# Altium footprint library 集大电协1.5.PcbLib: 273 footprints (part 17 of 18)
Each footprint in its own frame and in the unit in brackets; x right, y up, seen from the top. Pads: shape width x height; smd on the part's side, far side on the other; paste and mask are expansions set on the pad; w line width, h text height; cw(c..) or ccw(c..) is an arc to the next point about the centre after c.
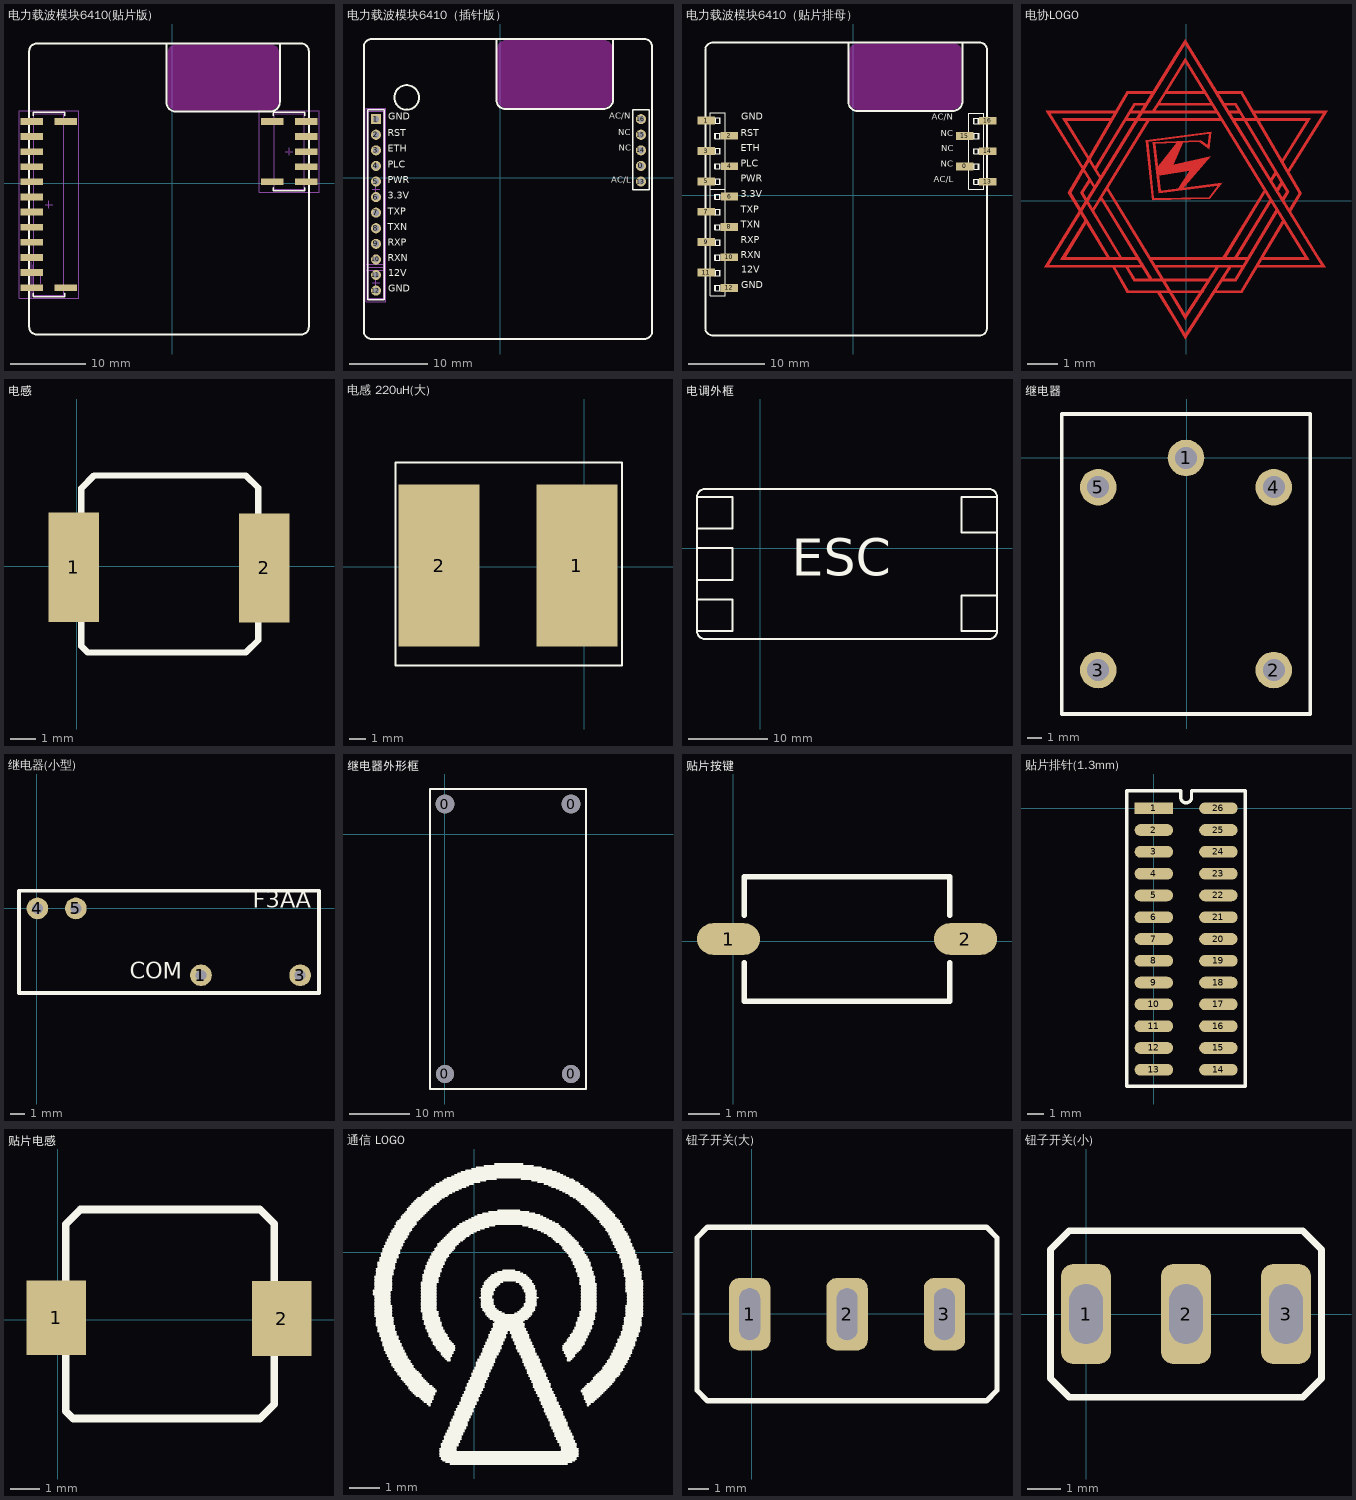
[diagram p16: the footprints below, top view; thin cyan lines are the x and y axes]

## 电力载波模块6410(贴片版) [mm]
pads (21):
  rect 3x0.89 smd: 0(-14.05,-13.8) 0(-14.05,8.2) 0(13.25,0.2) 0(13.25,8.2) 0(17.75,2.2) 1(-18.55,8.2) 2(-18.55,6.2) 3(-18.55,4.2) 4(-18.55,2.2) 5(-18.55,0.2) 6(-18.55,-1.8) 7(-18.55,-3.8) 8(-18.55,-5.8) 9(-18.55,-7.8) 10(-18.55,-9.8) 11(-18.55,-11.8) 12(-18.55,-13.8) 13(17.75,0.2) 14(17.75,4.2) 15(17.75,6.2) 16(17.75,8.2)
Top Overlay:
  lines w0.2: -18.375,-14.55 -18.375,-15 -14.225,-15 -14.225,-14.55 ; -18.375,8.95 -18.375,9.4 -14.225,9.4 -14.225,8.95 ; 13.425,-0.55 13.425,-1 17.575,-1 17.575,-0.55 ; 13.425,8.95 13.425,9.4 17.575,9.4 17.575,8.95
  lines w0.254: -0.729,18.511 -0.729,10.711 ccw(c0.471,10.711) 0.471,9.511 12.99,9.511 ccw(c12.99,10.793) 14.271,10.793 14.271,18.511 ; -18.9,-19 ccw(c-17.9,-19) -17.9,-20 17.1,-20 ccw(c17.1,-19) 18.1,-19 18.1,17.5 ccw(c17.1,17.5) 17.1,18.5 -17.9,18.5 ccw(c-17.9,17.5) -18.9,17.5 -18.9,-19
Keep-Out Layer:
  board cut-out: -0.574,10.764 -0.575,10.768 -0.576,10.774 -0.576,10.781 -0.577,10.787 -0.577,10.791 -0.577,17.321 -0.577,17.323 -0.577,17.325 -0.577,17.328 -0.576,17.331 -0.576,17.332 -0.573,17.434 -0.528,17.633 -0.446,17.819 -0.33,17.986 -0.184,18.128 -0.013,18.24 0.176,18.316 0.376,18.355 0.477,18.355 13.138,18.355 13.236,18.355 13.427,18.317 13.607,18.243 13.769,18.134 13.907,17.996 14.015,17.834 14.09,17.654 14.128,17.463 14.128,17.365 14.128,10.799 14.128,10.796 14.128,10.789 14.127,10.782 14.126,10.775 14.125,10.772 14.117,10.661 14.06,10.446 13.964,10.246 13.833,10.068 13.67,9.916 13.482,9.798 13.276,9.717 13.058,9.676 12.947,9.676 0.501,9.676 0.495,9.676 0.484,9.677 0.473,9.679 0.462,9.682 0.456,9.684 0.356,9.695 0.161,9.753 -0.021,9.844 -0.184,9.964 -0.324,10.111 -0.437,10.28 -0.518,10.466 -0.567,10.663
  lines w0.254: -0.449,10.791 -0.449,17.321 ; -0.449,10.844 ccw(c0.592,10.844) 0.592,9.803 ; -0.449,17.301 cw(c0.477,17.301) 0.477,18.228 13.138,18.228 cw(c13.138,17.365) 14.001,17.365 14.001,10.799 ; 0.501,9.803 12.947,9.803 ccw(c12.947,10.857) 14.001,10.857
Mechanical 13:
  lines w0.1: -18.341,-10.789 -18.341,-14.789 -16.341,-14.789 ; -18.3,-14.05 -19.4,-14.05 -19.4,-13.55 -18.3,-13.55 ; -18.3,-12.05 -19.4,-12.05 -19.4,-11.55 -18.3,-11.55 ; -18.3,-10.05 -19.4,-10.05 -19.4,-9.55 -18.3,-9.55 ; -18.3,-8.05 -19.4,-8.05 -19.4,-7.55 -18.3,-7.55 ; -18.3,-6.05 -19.4,-6.05 -19.4,-5.55 -18.3,-5.55 ; -18.3,-4.05 -19.4,-4.05 -19.4,-3.55 -18.3,-3.55 ; -18.3,-2.05 -19.4,-2.05 -19.4,-1.55 -18.3,-1.55 ; -18.3,-0.05 -19.4,-0.05 -19.4,0.45 -18.3,0.45 ; -18.3,1.95 -19.4,1.95 -19.4,2.45 -18.3,2.45 ; -18.3,3.95 -19.4,3.95 -19.4,4.45 -18.3,4.45 ; -18.3,5.95 -19.4,5.95 -19.4,6.45 -18.3,6.45 ; -18.3,7.95 -19.4,7.95 -19.4,8.45 -18.3,8.45 ; -14.3,-14.05 -13.2,-14.05 -13.2,-13.55 -14.3,-13.55 ; -14.3,7.95 -13.2,7.95 -13.2,8.45 -14.3,8.45 ; 13.5,-0.05 12.4,-0.05 12.4,0.45 13.5,0.45 ; 13.5,7.95 12.4,7.95 12.4,8.45 13.5,8.45 ; 17.5,-0.05 18.6,-0.05 18.6,0.45 17.5,0.45 ; 17.5,1.95 18.6,1.95 18.6,2.45 17.5,2.45 ; 17.5,3.95 18.6,3.95 18.6,4.45 17.5,4.45 ; 17.5,5.95 18.6,5.95 18.6,6.45 17.5,6.45 ; 17.5,7.95 18.6,7.95 18.6,8.45 17.5,8.45 ; -18.3,-14.8 -14.3,-14.8 -14.3,9.2 -18.3,9.2 -18.3,-14.8 ; 13.5,-0.8 17.5,-0.8 17.5,9.2 13.5,9.2 13.5,-0.8
Mechanical 15:
  lines w0.05: -18.616,-10.389 -18.616,-15.189 -16.066,-15.189 ; -17.341,-13.289 -17.341,-12.289 ; -16.8,-2.8 -15.8,-2.8 ; -16.3,-3.3 -16.3,-2.3 ; 15,4.2 16,4.2 ; 15.5,3.7 15.5,4.7 ; -20.25,-15.2 -12.35,-15.2 -12.35,9.6 -20.25,9.6 -20.25,-15.2 ; 11.55,-1.2 19.45,-1.2 19.45,9.6 11.55,9.6 11.55,-1.2
3D body "62131021921.stp": height 6.7, standoff 0, extent 12.4,-0.8 18.6,9.2
3D body "62132421921.stp": height 6.7, standoff 0, extent -19.4,-14.8 -13.2,9.2

## 电力载波模块6410（插针版） [mm]
pads (17):
  round 1.3 hole 0.8: 0(18.059,1.511) 2(-15.941,5.511) 3(-15.941,3.511) 4(-15.941,1.511) 5(-15.941,-0.489) 6(-15.941,-2.489) 7(-15.941,-4.489) 8(-15.941,-6.489) 9(-15.941,-8.489) 10(-15.941,-10.489) 11(-15.941,-12.489) 12(-15.941,-14.489) 13(18.059,-0.489) 14(18.059,3.511) 15(18.059,5.511) 16(18.059,7.511)
  rect 1.3x1.3 hole 0.8: 1(-15.941,7.511)
Top Overlay:
  circle w0.254: c-12,10.3 r1.581
  lines w0.2: -17.016,-11.689 -17.016,8.711 -14.866,8.711 -14.866,-11.689 ; -17.016,-11.289 -17.016,-15.689 -14.866,-15.689 -14.866,-11.289 ; 16.984,-1.555 16.984,8.711 19.134,8.711 19.134,-1.555 16.984,-1.555
  lines w0.254: -0.5,17.8 -0.5,9.999 ccw(c0.699,9.999) 0.699,8.8 13.218,8.8 ccw(c13.218,10.082) 14.5,10.082 14.5,17.8 ; -17.5,-19.7 ccw(c-16.5,-19.7) -16.5,-20.7 18.5,-20.7 ccw(c18.5,-19.7) 19.5,-19.7 19.5,16.8 ccw(c18.5,16.8) 18.5,17.8 -16.5,17.8 ccw(c-16.5,16.8) -17.5,16.8 -17.5,-19.7
  text "NC" at 15.182,3.17 h1.4
  text "NC" at 15.156,5.125 h1.4
  text "AC/L" at 14.242,-0.945 h1.4
  text "AC/N" at 13.963,7.259 h1.4
  text "GND" at -14.358,-14.966 h1.52
  text "12V" at -14.36,-12.973 h1.52
  text "RXN" at -14.46,-11.067 h1.52
  text "RXP" at -14.46,-9.06 h1.52
  text "TXN" at -14.458,-7.054 h1.52
  text "TXP" at -14.458,-5.047 h1.52
  text "3.3V" at -14.46,-3.026 h1.52
  text "PWR" at -14.46,-1.034 h1.52
  text "PLC" at -14.46,0.987 h1.52
  text "ETH" at -14.46,2.979 h1.52
  text "RST" at -14.46,5 h1.52
  text "GND" at -14.358,7.107 h1.52
Keep-Out Layer:
  board cut-out: -0.345,10.053 -0.346,10.056 -0.347,10.063 -0.348,10.07 -0.348,10.076 -0.348,10.079 -0.348,16.61 -0.348,16.611 -0.348,16.614 -0.348,16.617 -0.348,16.62 -0.348,16.621 -0.345,16.723 -0.3,16.921 -0.218,17.108 -0.101,17.275 0.045,17.417 0.215,17.528 0.404,17.605 0.604,17.644 0.706,17.644 13.367,17.644 13.464,17.644 13.655,17.606 13.836,17.531 13.998,17.423 14.136,17.285 14.244,17.123 14.319,16.943 14.357,16.752 14.357,16.654 14.357,10.088 14.357,10.085 14.356,10.078 14.355,10.071 14.354,10.064 14.353,10.06 14.345,9.95 14.289,9.735 14.193,9.535 14.061,9.356 13.899,9.205 13.711,9.087 13.504,9.006 13.286,8.964 13.175,8.964 0.729,8.964 0.724,8.964 0.712,8.965 0.701,8.967 0.69,8.97 0.685,8.972 0.584,8.984 0.39,9.042 0.208,9.133 0.045,9.253 -0.095,9.4 -0.208,9.569 -0.29,9.755 -0.338,9.952
  lines w0.254: -0.221,10.079 -0.221,16.61 ; -0.221,10.133 ccw(c0.821,10.133) 0.821,9.092 ; -0.221,16.59 cw(c0.706,16.59) 0.706,17.517 13.367,17.517 cw(c13.367,16.654) 14.229,16.654 14.229,10.088 ; 0.729,9.092 13.175,9.092 ccw(c13.175,10.146) 14.229,10.146
Mechanical 13:
  lines w0.1: -16.941,-11.489 -14.941,-11.489 ; -16.941,-11.489 -16.941,-15.489 -14.941,-15.489 -14.941,-11.489 ; -16.941,-11.489 -16.941,8.511 -14.941,8.511 -14.941,-11.489 ; -16.941,-11.489 -14.941,-11.489
Mechanical 15:
  lines w0.05: -16.441,-13.489 -15.441,-13.489 ; -16.441,-1.489 -15.441,-1.489 ; -15.941,-13.989 -15.941,-12.989 ; -15.941,-1.989 -15.941,-0.989 ; -17.216,-15.889 -17.216,-11.089 -14.666,-11.089 -14.666,-15.889 -17.216,-15.889 ; -17.216,-11.889 -17.216,8.911 -14.666,8.911 -14.666,-11.889 -17.216,-11.889
3D body "62000211821.stp": height 4.35, standoff -2.65, extent -17.149,-15.616 -14.649,-11.116
3D body "62001011821.stp": height 4.35, standoff -2.65, extent -17.139,-11.569 -14.639,8.931
3D body "62000211821.stp": height 4.35, standoff -2.65, extent 16.782,2.255 19.282,6.755
3D body "62000211821.stp": height 4.35, standoff -2.65, extent 16.802,-1.788 19.302,2.712
3D body "62000211821.stp": height 4.35, standoff -2.65, extent 16.797,4.41 19.297,8.91

## 电力载波模块6410（贴片排母） [mil]
pads (17):
  rect 90.16x40.16 smd mask+0: 0(575,148.26) 1(-762,385.74) 2(-642,307) 3(-762,228.26) 4(-641,150) 5(-761,71.26) 6(-641,-7.48) 7(-761,-86.22) 8(-642,-164) 9(-762,-242.74) 10(-642,-321.48) 11(-762,-400.22) 12(-642,-479.48) 13(695,69.52) 14(695,227) 15(575,305.74) 16(695,384.48)
Top Overlay:
  drawing of 154 lines, arcs and shapes, not listed
  text "NC" at 452.71,214.79 h55
  text "NC" at 451.71,291.79 h55
  text "AC/L" at 415.71,52.79 h55
  text "AC/N" at 404.71,375.79 h55
  text "GND" at -579.29,-493.21 h60
  text "12V" at -579.35,-414.77 h60
  text "RXN" at -583.28,-339.7 h60
  text "RXP" at -583.28,-260.7 h60
  text "TXN" at -583.23,-181.7 h60
  text "TXP" at -583.23,-102.7 h60
  text "3.3V" at -583.28,-23.15 h60
  text "PWR" at -583.28,55.3 h60
  text "PLC" at -583.28,134.85 h60
  text "ETH" at -583.28,213.3 h60
  text "RST" at -583.28,292.85 h60
  text "GND" at -579.29,375.79 h60
  text "NC" at 451.71,132.79 h55
Top Paste:
  region: 740.08,49.44 649.92,49.44 649.92,89.6 740.08,89.6
  region: 620.08,128.18 529.92,128.18 529.92,168.34 620.08,168.34
  region: 740.08,206.92 649.92,206.92 649.92,247.08 740.08,247.08
  region: 620.08,285.66 529.92,285.66 529.92,325.82 620.08,325.82
  region: 740.08,364.4 649.92,364.4 649.92,404.56 740.08,404.56
  region: -807.08,405.82 -716.92,405.82 -716.92,365.66 -807.08,365.66
  region: -687.08,327.08 -596.92,327.08 -596.92,286.92 -687.08,286.92
  region: -807.08,248.34 -716.92,248.34 -716.92,208.18 -807.08,208.18
  region: -687.08,169.6 -596.92,169.6 -596.92,129.44 -687.08,129.44
  region: -807.08,90.86 -716.92,90.86 -716.92,50.7 -807.08,50.7
  region: -806.08,-66.14 -715.92,-66.14 -715.92,-106.3 -806.08,-106.3
  region: -687.08,-301.4 -596.92,-301.4 -596.92,-341.56 -687.08,-341.56
  region: -807.08,-222.66 -716.92,-222.66 -716.92,-262.82 -807.08,-262.82
  region: -687,-143.66 -596.84,-143.66 -596.84,-183.82 -687,-183.82
  region: -686,12.42 -595.84,12.42 -595.84,-27.74 -686,-27.74
  region: -807.08,-380.66 -716.92,-380.66 -716.92,-420.82 -807.08,-420.82
  region: -687.08,-459.4 -596.92,-459.4 -596.92,-499.56 -687.08,-499.56
Top Solder:
  region: 742.09,47.43 647.91,47.43 647.91,91.61 742.09,91.61
  region: 622.09,126.17 527.91,126.17 527.91,170.35 622.09,170.35
  region: 742.09,204.91 647.91,204.91 647.91,249.09 742.09,249.09
  region: 622.09,283.65 527.91,283.65 527.91,327.83 622.09,327.83
  region: 742.09,362.39 647.91,362.39 647.91,406.57 742.09,406.57
  region: -809.09,407.83 -714.91,407.83 -714.91,363.65 -809.09,363.65
  region: -689.09,329.09 -594.91,329.09 -594.91,284.91 -689.09,284.91
  region: -809.09,250.35 -714.91,250.35 -714.91,206.17 -809.09,206.17
  region: -689.09,171.61 -594.91,171.61 -594.91,127.43 -689.09,127.43
  region: -809.09,92.87 -714.91,92.87 -714.91,48.69 -809.09,48.69
  region: -808.09,-64.13 -713.91,-64.13 -713.91,-108.31 -808.09,-108.31
  region: -809.09,-378.13 -714.91,-378.13 -714.91,-422.31 -809.09,-422.31
  region: -689.09,-299.39 -594.91,-299.39 -594.91,-343.57 -689.09,-343.57
  region: -809.09,-220.65 -714.91,-220.65 -714.91,-264.83 -809.09,-264.83
  region: -689,-141.56 -594.82,-141.56 -594.82,-185.74 -689,-185.74
  region: -689,14.35 -594.82,14.35 -594.82,-29.83 -689,-29.83
  region: -689.09,-457.39 -594.91,-457.39 -594.91,-501.57 -689.09,-501.57
Keep-Out Layer:
  board cut-out: -20.6,484.79 -20.63,484.92 -20.67,485.18 -20.69,485.44 -20.71,485.7 -20.71,485.83 -20.71,742.94 -20.71,742.99 -20.71,743.1 -20.7,743.21 -20.69,743.31 -20.69,743.37 -20.57,747.38 -18.8,755.2 -15.57,762.54 -10.99,769.13 -5.24,774.71 1.48,779.09 8.92,782.11 16.79,783.64 20.8,783.64 519.25,783.64 523.09,783.64 530.62,782.15 537.71,779.21 544.09,774.95 549.52,769.52 553.78,763.13 556.72,756.04 558.22,748.51 558.22,744.68 558.22,486.18 558.22,486.04 558.2,485.76 558.17,485.49 558.13,485.22 558.1,485.08 557.78,480.72 555.54,472.28 551.76,464.4 546.59,457.36 540.19,451.41 532.8,446.75 524.67,443.56 516.08,441.93 511.71,441.93 21.71,441.93 21.49,441.93 21.04,441.97 20.61,442.05 20.18,442.16 19.97,442.24 16,442.7 8.34,444.98 1.19,448.55 -5.24,453.3 -10.75,459.08 -15.19,465.73 -18.41,473.05 -20.33,480.81
  lines w10: -15.69,485.83 -15.69,742.94 ; -15.69,487.94 ccw(c25.31,487.94) 25.31,446.94 ; -15.69,742.14 cw(c20.8,742.14) 20.8,778.63 519.25,778.63 cw(c519.25,744.68) 553.2,744.68 553.2,486.18 ; 21.71,446.94 511.71,446.94 ccw(c511.71,488.44) 553.2,488.44
3D body "HDR2.0-M-LI-12P.STEP": height 216.54, standoff -89.5, extent -739.57,-517.87 -660.83,427.01
3D body "HDR2.0-M-LI-5P.STEP": height 216.54, standoff -89.5, extent 595.38,28.72 674.12,422.42

## 电协LOGO [mm]
Top Layer:
  region: 2.969,0.374 3.122,0.628 3.172,0.578 3.172,0.527 3.045,0.324 2.995,0.324
  region: 2.766,0.705 2.918,0.959 2.969,0.908 2.969,0.857 2.842,0.654 2.791,0.654
  region: 1.648,2.711 4.087,2.711 4.112,2.711 3.172,1.213 3.147,1.34 3.96,2.635 1.674,2.635
  region: 2.207,2.965 4.646,2.965 4.671,2.965 3.401,0.933 3.337,0.997 4.519,2.889 2.233,2.889
  region: -0.663,3.6 0.607,3.6 0.632,3.575 0.658,3.549 0.683,3.524 -0.714,3.524
  region: 1.928,2.711 1.572,2.711 1.521,2.66 1.598,2.635 1.623,2.635 1.648,2.635 1.928,2.635
  region: 1.75,2.965 1.394,2.965 1.344,2.914 1.445,2.914 1.471,2.889 1.75,2.889
  region: -1.323,3.219 -1.73,3.219 -3.013,1.098 -2.949,1.035 -1.679,3.143 -1.374,3.143
  region: -0.942,3.219 0.836,3.219 0.81,3.219 0.861,3.194 0.861,3.143 -0.993,3.143
  region: -2.009,2.635 -1.958,2.711 1.115,2.711 1.166,2.635
  region: -1.781,2.965 0.988,2.965 0.988,2.94 1.013,2.889 -1.831,2.889
  region: 0.836,2.279 0.759,1.695 0.429,1.949 0.48,2 0.709,1.822 0.759,2.203 -1.247,1.949 -1.057,0.082 0.759,0.12 1.039,0.501 -0.892,0.247 -1.095,1.924 0.48,2 0.455,1.975 0.429,1.949 -1.019,1.873 -0.841,0.324 1.064,0.578 1.191,0.603 0.785,0.07 -1.12,0.019 -1.323,2
  region: -2.816,0.06 -1.192,-2.61 -1.108,-2.61 -1.117,-2.57 -2.797,0.171
  region: -2.613,0.364 -0.333,-3.385 -0.021,-3.914 1.115,-2.14 1.013,-2.14 -0.021,-3.74 -0.866,-2.343 -2.593,0.476
  region: -0.942,-3.029 -0.333,-4.02 -0.021,-4.549 1.521,-2.14 1.42,-2.14 -0.021,-4.375 -0.866,-2.978 -0.942,-3.004
  region: -1.895,-2.953 -0.828,-2.953 0.594,-2.953 0.569,-3.029 -1.946,-3.029 -2.454,-2.14 -2.352,-2.166
  region: -3.178,0.654 -3.193,0.746 -3.482,0.273 -2.173,-1.909 -2.111,-1.861 -3.381,0.273 -3.119,0.671
  region: 3.198,-0.591 1.801,-2.953 0.963,-2.953 0.912,-3.029 1.852,-3.029 3.249,-0.692
  region: 2.966,-0.266 1.598,-2.572 1.217,-2.572 1.191,-2.648 1.648,-2.648 3.045,-0.311
  region: 2.791,0.095 1.572,-1.886 1.674,-1.912 2.842,0.019
  region: 2.588,0.4 1.191,-1.873 1.217,-1.912 1.318,-1.861 2.639,0.324
  region: -1.298,2.66 -3.089,-0.273 -3.038,-0.349 -1.196,2.66
  region: -2.428,2.711 -4.079,2.711 -2.847,0.73 -2.771,0.755 -3.927,2.635 -2.517,2.635
  region: -2.314,2.965 -4.625,2.965 -3.025,0.4 -2.974,0.451 -4.473,2.889 -2.365,2.889
  region: -1.095,3.6 -1.957,3.6 -3.889,0.273 -2.58,-1.909 -2.517,-1.861 -3.787,0.273 -1.908,3.524 -1.095,3.524
  region: 1.013,3.6 1.852,3.6 3.807,0.247 3.426,-0.388 3.376,-0.286 3.706,0.247 1.801,3.524 1.013,3.524
  region: -1.679,-2.572 -0.612,-2.572 0.81,-2.572 0.785,-2.648 -1.73,-2.648 -2.009,-2.166 -1.908,-2.191
  region: -1.019,-2.115 0.759,-2.115 1.928,-2.115 1.902,-2.191 -1.019,-2.191
  region: -1.171,-1.861 0.607,-1.861 2.029,-1.861 2.004,-1.937 -1.171,-1.937
  region: 1.242,3.219 1.648,3.219 3.401,0.298 3.223,-0.007 3.172,0.095 3.299,0.298 1.598,3.143 1.293,3.143
  region: -1.12,2.965 -0.765,3.499 -0.028,4.718 4.061,-1.937 2.512,-1.937 2.563,-1.861 3.909,-1.861 -0.028,4.565 -1.019,2.965
  region: -0.028,5.327 -0.307,4.896 -4.676,-2.191 -4.473,-2.191 -1.45,-2.192 -1.4,-2.115 -1.568,-1.834 -1.654,-1.861 -3.965,-1.861 -3.279,-0.743 -3.33,-0.642 -4.143,-1.937 -1.603,-1.937 -1.488,-2.115 -4.524,-2.115 -0.028,5.15 1.344,2.914 4.442,-2.115 2.41,-2.115 2.36,-2.191 4.595,-2.191 4.341,-1.785
  region: -0.307,1.911 -0.961,1.079 -0.917,0.832 0.124,0.984 -0.282,0.374 -0.13,0.374 0.81,1.467 -0.422,1.187 -0.092,1.949
  text "集" at -1.552,-0.794 h0.76
  text "大" at 1.115,-0.794 h0.76
  text "电" at -0.739,-1.683 h0.76
  text "协" at 0.201,-1.683 h0.76
Top Solder:
  drawing of 33 lines, arcs and shapes, not listed
  text "协" at 0.201,-1.683 h0.76
  text "电" at -0.739,-1.683 h0.76
  text "大" at 1.115,-0.794 h0.76
  text "集" at -1.552,-0.794 h0.76

## 电感 [mm]
pads (2):
  rect 2x4.318 smd: 1(-0.12,-0.044) 2(7.423,-0.069)
Top Overlay:
  lines w0.254: 0.19,-3.167 0.44,-3.417 6.69,-3.417 7.175,-2.932 7.175,3.098 6.69,3.583 0.69,3.583 0.19,3.083 0.19,-3.167
3D body "User Library-Inductor VLC6045 Series.STEP": height 4.5, standoff 0, extent 0.636,-2.981 6.636,3.019

## 电感 220uH(大) [mm]
pads (2):
  rect 5x10 smd: 1(-0.444,0.06) 2(-8.944,0.06)
Top Overlay:
  lines w0.127: -11.62,-6.09 2.325,-6.09 2.325,6.41 -11.62,6.41 -11.62,-6.09
3D body: height 4, standoff 0, extent -8.597,-3.279 -1.485,3.833

## 电调外框 [mm]
Top Overlay:
  lines w0.254: -8,-6.5 -3.5,-6.5 -3.5,-10.5 -8,-10.5 ; -8,-4 -3.5,-4 -3.5,0 -8,0 ; -8,2.5 -3.5,2.5 -3.5,6.5 -8,6.5 ; 30,-6 25.5,-6 25.5,-10.5 30,-10.5 ; 30,2 25.5,2 25.5,6.5 30,6.5 ; -8,-10.5 ccw(c-7,-10.5) -7,-11.5 29,-11.5 ccw(c29,-10.5) 30,-10.5 ; -8,-10.5 -8,6.5 ; -8,6.5 cw(c-7,6.5) -7,7.5 29,7.5 cw(c29,6.5) 30,6.5 ; 30,-10.5 30,6.5
  text "ESC" at 4,-5 h8

## 继电器 [mil]
pads (5):
  round 100 hole 60: 1(-2.19,-1.05) 2(237.81,-581.05) 3(-242.19,-581.05) 4(237.81,-81.05) 5(-242.19,-81.05)
Top Overlay:
  lines w10: -342.19,58.95 -342.19,118.95 337.81,118.95 ; -342.19,78.95 -342.19,-701.05 337.81,-701.05 337.81,78.95 337.81,118.95 ; -262.19,118.95 337.81,118.95
3D body "继电器.ST": height 587.01, standoff -98.43, extent -330.71,-732.28 334.65,133.86

## 继电器(小型) [mil] "F3AA (20mm*7mm)"
pads (4):
  round 60 hole 30: 1(454.72,-186.02) 3(729.33,-186.02) 4(1.97,-0.98) 5(108.27,-0.98)
Top Overlay:
  lines w10: -49.21,-235.24 -49.21,48.23 781.5,48.23 781.5,-235.24 -49.21,-235.24
  text "F3AA" at 597.44,-14.76 h78.74
  text "COM" at 257.87,-211.61 h78.74
Mechanical 1:
3D body: height 590.55, standoff 0, extent -50.2,-232.28 780.51,49.21

## 继电器外形框 [mm]
pads (4):
  round 3 hole 3: 0(0,-40) 0(21,-40)
  round 3.1 hole 3.1: 0(0,5) 0(21,5)
Top Overlay:
  lines w0.254: -2.5,-42.5 23.5,-42.5 23.5,7.5 7.5,7.5 -2.5,7.5 -2.5,-42.5
3D body: height 20, standoff 10, extent -2.5,-42.5 23.5,7.5
3D body: height 15, standoff 0, extent -1.542,3.452 1.55,6.548
3D body: height 15, standoff 0, extent 19.458,3.452 22.55,6.548
3D body: height 15, standoff 0, extent 19.458,-41.548 22.55,-38.452
3D body: height 15, standoff 0, extent -1.542,-41.548 1.55,-38.452
3D body: height 25, standoff 15, extent 4.5,-35 17.5,-17.5

## 贴片按键 [mil]
pads (2):
  oval 80x40 smd: 1(-5.71,2.8) 2(294.29,2.8)
Top Overlay:
  lines w7: 14.13,-27.2 14.13,-75.94 274.19,-75.94 274.45,-27.21 ; 14.13,32.8 14.13,81.54 274.29,81.54 274.29,32.8
3D body: height 47.24, standoff 31.5, extent 94.29,-27.2 194.29,32.8
3D body "TVBU19.STEP": height 98.43, standoff 0, extent 24.22,-69.03 264.38,76.64

## 贴片排针(1.3mm) [mm]
pads (26):
  rect 2.3x0.7 smd: 1(0,0)
  oval 2.3x0.7 smd: 2(0,-1.3) 3(0,-2.6) 4(0,-3.9) 5(0,-5.2) 6(0,-6.5) 7(0,-7.8) 8(0,-9.1) 9(0,-10.4) 10(0,-11.7) 11(0,-13) 12(0,-14.3) 13(0,-15.6) 14(3.85,-15.6) 15(3.85,-14.3) 16(3.85,-13) 17(3.85,-11.7) 18(3.85,-10.4) 19(3.85,-9.1) 20(3.85,-7.8) 21(3.85,-6.5) 22(3.85,-5.2) 23(3.85,-3.9) 24(3.85,-2.6) 25(3.85,-1.3) 26(3.85,0)
Top Overlay:
  lines w0.2: -1.626,-16.586 -1.626,1.041 1.6,1.041 1.6,0.65 ccw(c1.925,0.65) 2.25,0.65 2.25,1.041 5.461,1.041 5.461,-16.586 -1.626,-16.586

## 贴片电感 [mm]
pads (2):
  rect 2x2.5 smd: 1(-0.048,0.065) 2(7.496,0.04)
Top Overlay:
  lines w0.254: 0.262,-3.058 0.262,3.192 0.762,3.692 6.762,3.692 7.247,3.207 7.247,-2.823 6.762,-3.308 0.512,-3.308 0.262,-3.058
3D body "User Library-Inductor VLC6045 Series.STEP": height 4.5, standoff 0, extent 0.709,-2.873 6.709,3.127

## 通信 LOGO [mm]
Top Overlay:
  drawing of 720 lines, arcs and shapes, not listed

## 钮子开关(大) [mm]
pads (3):
  rrect50% 2x3.5 hole 1 slot 2.5 at 90 deg: 1(-0.102,-0.025) 2(4.598,-0.025) 3(9.298,-0.025)
Top Overlay:
  lines w0.254: 10.817,4.175 11.071,4.175 ; 11.071,4.175 11.325,4.175 11.833,3.667 11.833,-0.143 11.833,-3.699 11.325,-4.207 -2.137,-4.207 -2.645,-3.699 -2.645,3.667 -2.137,4.175 11.071,4.175
3D body: height 28.19, standoff -3.17, extent -1.85,-6.06 10.85,5.8

## 钮子开关(小) [mm]
pads (3):
  rrect50% 1.5x3 hole 1 slot 1.8 at 90 deg: 1(0,0) 2(3,0) 3(6,0)
Top Overlay:
  lines w0.2: -1.064,-1.936 -1.064,1.936 -0.5,2.5 6.5,2.5 7.064,1.936 7.064,-1.936 6.5,-2.5 3,-2.5 -0.5,-2.5 -1.064,-1.936